# Altium footprint library con-samtec.PCBLIB: 805 footprints (part 12 of 55)
Each footprint in its own frame and in the unit in brackets; x right, y up, seen from the top. Pads: shape width x height; smd on the part's side, far side on the other; paste and mask are expansions set on the pad; w line width, h text height; cw(c..) or ccw(c..) is an arc to the next point about the centre after c.
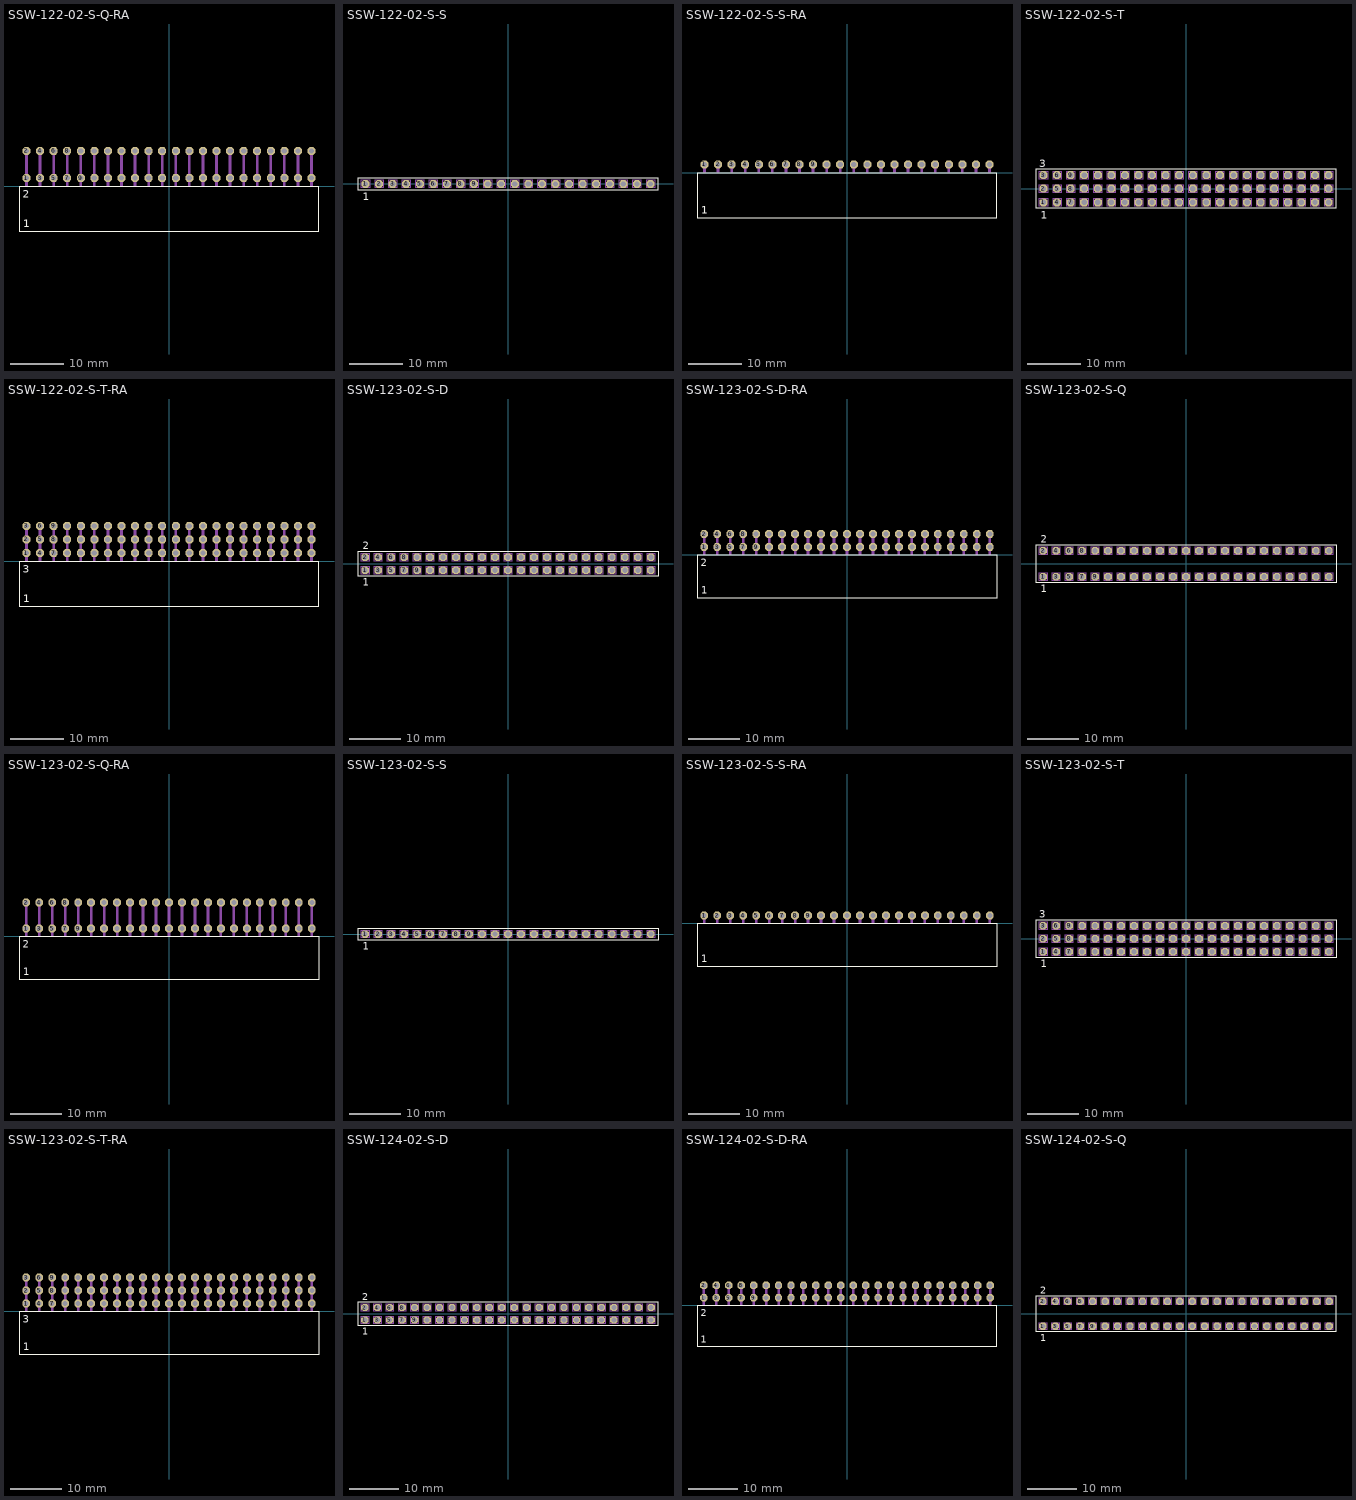
[diagram p11: the footprints below, top view; thin cyan lines are the x and y axes]

## SSW-122-02-S-Q-RA [mil]
pads (44):
  oct 59.06x59.06 hole 39.37: 1(-1050,60) 2(-1050,260) 3(-950,60) 4(-950,260) 5(-850,60) 6(-850,260) 7(-750,60) 8(-750,260) 9(-650,60) 10(-650,260) 11(-550,60) 12(-550,260) 13(-450,60) 14(-450,260) 15(-350,60) 16(-350,260) 17(-250,60) 18(-250,260) 19(-150,60) 20(-150,260) 21(-50,60) 22(-50,260) 23(50,60) 24(50,260) 25(150,60) 26(150,260) 27(250,60) 28(250,260) 29(350,60) 30(350,260) 31(450,60) 32(450,260) 33(550,60) 34(550,260) 35(650,60) 36(650,260) 37(750,60) 38(750,260) 39(850,60) 40(850,260) 41(950,60) 42(950,260) 43(1050,60) 44(1050,260)
Top Overlay:
  lines w8: -1105.08,-330.55 1105.08,-330.55 1105.08,-4.17 -1105.08,-4.17 -1105.08,-330.55
  text "1" at -1073.43,-301.18 h56.1
  text "2" at -1076.38,-86.61 h56.1
Mechanical 16:
  rectangle: -1060,0 -1040,270
  rectangle: -960,0 -940,270
  rectangle: -860,0 -840,270
  rectangle: -760,0 -740,270
  rectangle: -660,0 -640,270
  rectangle: -560,0 -540,270
  rectangle: -460,0 -440,270
  rectangle: -360,0 -340,270
  rectangle: -260,0 -240,270
  rectangle: -160,0 -140,270
  rectangle: -60,0 -40,270
  rectangle: 40,0 60,270
  rectangle: 140,0 160,270
  rectangle: 240,0 260,270
  rectangle: 340,0 360,270
  rectangle: 440,0 460,270
  rectangle: 540,0 560,270
  rectangle: 640,0 660,270
  rectangle: 740,0 760,270
  rectangle: 840,0 860,270
  rectangle: 940,0 960,270
  rectangle: 1040,0 1060,270

## SSW-122-02-S-S [mm]
pads (22):
  oct 1.5x1.5 hole 1: 1(-26.67,0) 2(-24.13,0) 3(-21.59,0) 4(-19.05,0) 5(-16.51,0) 6(-13.97,0) 7(-11.43,0) 8(-8.89,0) 9(-6.35,0) 10(-3.81,0) 11(-1.27,0) 12(1.27,0) 13(3.81,0) 14(6.35,0) 15(8.89,0) 16(11.43,0) 17(13.97,0) 18(16.51,0) 19(19.05,0) 20(21.59,0) 21(24.13,0) 22(26.67,0)
Top Overlay:
  lines w0.203: -28.069,-1.155 28.069,-1.155 28.069,1.155 -28.069,1.155 -28.069,-1.155
  text "1" at -27.178,-3.048 h1.42
Mechanical 16:
  lines w0.203: -27.415,-0.745 -25.915,-0.745 -25.915,0.755 -27.415,0.755 -27.415,-0.745 ; -24.875,-0.745 -23.375,-0.745 -23.375,0.755 -24.875,0.755 -24.875,-0.745 ; -22.335,-0.745 -20.835,-0.745 -20.835,0.755 -22.335,0.755 -22.335,-0.745 ; -19.795,-0.745 -18.295,-0.745 -18.295,0.755 -19.795,0.755 -19.795,-0.745 ; -17.255,-0.745 -15.755,-0.745 -15.755,0.755 -17.255,0.755 -17.255,-0.745 ; -14.715,-0.745 -13.215,-0.745 -13.215,0.755 -14.715,0.755 -14.715,-0.745 ; -12.175,-0.745 -10.675,-0.745 -10.675,0.755 -12.175,0.755 -12.175,-0.745 ; -9.635,-0.745 -8.135,-0.745 -8.135,0.755 -9.635,0.755 -9.635,-0.745 ; -7.095,-0.745 -5.595,-0.745 -5.595,0.755 -7.095,0.755 -7.095,-0.745 ; -4.555,-0.745 -3.055,-0.745 -3.055,0.755 -4.555,0.755 -4.555,-0.745 ; -2.015,-0.745 -0.515,-0.745 -0.515,0.755 -2.015,0.755 -2.015,-0.745 ; 0.525,-0.745 2.025,-0.745 2.025,0.755 0.525,0.755 0.525,-0.745 ; 3.065,-0.745 4.565,-0.745 4.565,0.755 3.065,0.755 3.065,-0.745 ; 5.605,-0.745 7.105,-0.745 7.105,0.755 5.605,0.755 5.605,-0.745 ; 8.145,-0.745 9.645,-0.745 9.645,0.755 8.145,0.755 8.145,-0.745 ; 10.685,-0.745 12.185,-0.745 12.185,0.755 10.685,0.755 10.685,-0.745 ; 13.225,-0.745 14.725,-0.745 14.725,0.755 13.225,0.755 13.225,-0.745 ; 15.765,-0.745 17.265,-0.745 17.265,0.755 15.765,0.755 15.765,-0.745 ; 18.305,-0.745 19.805,-0.745 19.805,0.755 18.305,0.755 18.305,-0.745 ; 20.845,-0.745 22.345,-0.745 22.345,0.755 20.845,0.755 20.845,-0.745 ; 23.385,-0.745 24.885,-0.745 24.885,0.755 23.385,0.755 23.385,-0.745 ; 25.925,-0.745 27.425,-0.745 27.425,0.755 25.925,0.755 25.925,-0.745

## SSW-122-02-S-S-RA [mil]
pads (22):
  oct 59.06x59.06 hole 39.37: 1(-1050,60) 2(-950,60) 3(-850,60) 4(-750,60) 5(-650,60) 6(-550,60) 7(-450,60) 8(-350,60) 9(-250,60) 10(-150,60) 11(-50,60) 12(50,60) 13(150,60) 14(250,60) 15(350,60) 16(450,60) 17(550,60) 18(650,60) 19(750,60) 20(850,60) 21(950,60) 22(1050,60)
Top Overlay:
  lines w8: -1105.08,-330.55 1105.08,-330.55 1105.08,-4.17 -1105.08,-4.17 -1105.08,-330.55
  text "1" at -1073.43,-301.18 h56.1
Mechanical 16:
  rectangle: -1060,0 -1040,70
  rectangle: -960,0 -940,70
  rectangle: -860,0 -840,70
  rectangle: -760,0 -740,70
  rectangle: -660,0 -640,70
  rectangle: -560,0 -540,70
  rectangle: -460,0 -440,70
  rectangle: -360,0 -340,70
  rectangle: -260,0 -240,70
  rectangle: -160,0 -140,70
  rectangle: -60,0 -40,70
  rectangle: 40,0 60,70
  rectangle: 140,0 160,70
  rectangle: 240,0 260,70
  rectangle: 340,0 360,70
  rectangle: 440,0 460,70
  rectangle: 540,0 560,70
  rectangle: 640,0 660,70
  rectangle: 740,0 760,70
  rectangle: 840,0 860,70
  rectangle: 940,0 960,70
  rectangle: 1040,0 1060,70

## SSW-122-02-S-T [mm]
pads (66):
  oct 1.5x1.5 hole 1: 1(-26.67,-2.54) 2(-26.67,0) 3(-26.67,2.54) 4(-24.13,-2.54) 5(-24.13,0) 6(-24.13,2.54) 7(-21.59,-2.54) 8(-21.59,0) 9(-21.59,2.54) 10(-19.05,-2.54) 11(-19.05,0) 12(-19.05,2.54) 13(-16.51,-2.54) 14(-16.51,0) 15(-16.51,2.54) 16(-13.97,-2.54) 17(-13.97,0) 18(-13.97,2.54) 19(-11.43,-2.54) 20(-11.43,0) 21(-11.43,2.54) 22(-8.89,-2.54) 23(-8.89,0) 24(-8.89,2.54) 25(-6.35,-2.54) 26(-6.35,0) 27(-6.35,2.54) 28(-3.81,-2.54) 29(-3.81,0) 30(-3.81,2.54) 31(-1.27,-2.54) 32(-1.27,0) 33(-1.27,2.54) 34(1.27,-2.54) 35(1.27,0) 36(1.27,2.54) 37(3.81,-2.54) 38(3.81,0) 39(3.81,2.54) 40(6.35,-2.54) 41(6.35,0) 42(6.35,2.54) 43(8.89,-2.54) 44(8.89,0) 45(8.89,2.54) 46(11.43,-2.54) 47(11.43,0) 48(11.43,2.54) 49(13.97,-2.54) 50(13.97,0) 51(13.97,2.54) 52(16.51,-2.54) 53(16.51,0) 54(16.51,2.54) 55(19.05,-2.54) 56(19.05,0) 57(19.05,2.54) 58(21.59,-2.54) 59(21.59,0) 60(21.59,2.54) 61(24.13,-2.54) 62(24.13,0) 63(24.13,2.54) 64(26.67,-2.54) 65(26.67,0) 66(26.67,2.54)
Top Overlay:
  lines w0.203: -28.069,-3.695 28.069,-3.695 28.069,3.695 -28.069,3.695 -28.069,-3.695
  text "1" at -27.178,-5.588 h1.42
  text "3" at -27.432,4.064 h1.42
Mechanical 16:
  drawing of 264 lines, arcs and shapes, not listed

## SSW-122-02-S-T-RA [mil]
pads (66):
  oct 59.06x59.06 hole 39.37: 1(-1050,60) 2(-1050,160) 3(-1050,260) 4(-950,60) 5(-950,160) 6(-950,260) 7(-850,60) 8(-850,160) 9(-850,260) 10(-750,60) 11(-750,160) 12(-750,260) 13(-650,60) 14(-650,160) 15(-650,260) 16(-550,60) 17(-550,160) 18(-550,260) 19(-450,60) 20(-450,160) 21(-450,260) 22(-350,60) 23(-350,160) 24(-350,260) 25(-250,60) 26(-250,160) 27(-250,260) 28(-150,60) 29(-150,160) 30(-150,260) 31(-50,60) 32(-50,160) 33(-50,260) 34(50,60) 35(50,160) 36(50,260) 37(150,60) 38(150,160) 39(150,260) 40(250,60) 41(250,160) 42(250,260) 43(350,60) 44(350,160) 45(350,260) 46(450,60) 47(450,160) 48(450,260) 49(550,60) 50(550,160) 51(550,260) 52(650,60) 53(650,160) 54(650,260) 55(750,60) 56(750,160) 57(750,260) 58(850,60) 59(850,160) 60(850,260) 61(950,60) 62(950,160) 63(950,260) 64(1050,60) 65(1050,160) 66(1050,260)
Top Overlay:
  lines w8: -1105.08,-330.55 1105.08,-330.55 1105.08,-4.17 -1105.08,-4.17 -1105.08,-330.55
  text "1" at -1073.43,-301.18 h56.1
  text "3" at -1076.38,-86.61 h56.1
Mechanical 16:
  rectangle: -1060,0 -1040,270
  rectangle: -960,0 -940,270
  rectangle: -860,0 -840,270
  rectangle: -760,0 -740,270
  rectangle: -660,0 -640,270
  rectangle: -560,0 -540,270
  rectangle: -460,0 -440,270
  rectangle: -360,0 -340,270
  rectangle: -260,0 -240,270
  rectangle: -160,0 -140,270
  rectangle: -60,0 -40,270
  rectangle: 40,0 60,270
  rectangle: 140,0 160,270
  rectangle: 240,0 260,270
  rectangle: 340,0 360,270
  rectangle: 440,0 460,270
  rectangle: 540,0 560,270
  rectangle: 640,0 660,270
  rectangle: 740,0 760,270
  rectangle: 840,0 860,270
  rectangle: 940,0 960,270
  rectangle: 1040,0 1060,270

## SSW-123-02-S-D [mm]
pads (46):
  oct 1.5x1.5 hole 1: 1(-27.94,-1.27) 2(-27.94,1.27) 3(-25.4,-1.27) 4(-25.4,1.27) 5(-22.86,-1.27) 6(-22.86,1.27) 7(-20.32,-1.27) 8(-20.32,1.27) 9(-17.78,-1.27) 10(-17.78,1.27) 11(-15.24,-1.27) 12(-15.24,1.27) 13(-12.7,-1.27) 14(-12.7,1.27) 15(-10.16,-1.27) 16(-10.16,1.27) 17(-7.62,-1.27) 18(-7.62,1.27) 19(-5.08,-1.27) 20(-5.08,1.27) 21(-2.54,-1.27) 22(-2.54,1.27) 23(0,-1.27) 24(0,1.27) 25(2.54,-1.27) 26(2.54,1.27) 27(5.08,-1.27) 28(5.08,1.27) 29(7.62,-1.27) 30(7.62,1.27) 31(10.16,-1.27) 32(10.16,1.27) 33(12.7,-1.27) 34(12.7,1.27) 35(15.24,-1.27) 36(15.24,1.27) 37(17.78,-1.27) 38(17.78,1.27) 39(20.32,-1.27) 40(20.32,1.27) 41(22.86,-1.27) 42(22.86,1.27) 43(25.4,-1.27) 44(25.4,1.27) 45(27.94,-1.27) 46(27.94,1.27)
Top Overlay:
  lines w0.203: -29.339,-2.425 29.339,-2.425 29.339,2.425 -29.339,2.425 -29.339,-2.425
  text "1" at -28.448,-4.318 h1.42
  text "2" at -28.448,2.794 h1.42
Mechanical 16:
  drawing of 184 lines, arcs and shapes, not listed

## SSW-123-02-S-D-RA [mil]
pads (46):
  oct 59.06x59.06 hole 39.37: 1(-1100,60) 2(-1100,160) 3(-1000,60) 4(-1000,160) 5(-900,60) 6(-900,160) 7(-800,60) 8(-800,160) 9(-700,60) 10(-700,160) 11(-600,60) 12(-600,160) 13(-500,60) 14(-500,160) 15(-400,60) 16(-400,160) 17(-300,60) 18(-300,160) 19(-200,60) 20(-200,160) 21(-100,60) 22(-100,160) 23(0,60) 24(0,160) 25(100,60) 26(100,160) 27(200,60) 28(200,160) 29(300,60) 30(300,160) 31(400,60) 32(400,160) 33(500,60) 34(500,160) 35(600,60) 36(600,160) 37(700,60) 38(700,160) 39(800,60) 40(800,160) 41(900,60) 42(900,160) 43(1000,60) 44(1000,160) 45(1100,60) 46(1100,160)
Top Overlay:
  lines w8: -1155.08,-330.55 1155.08,-330.55 1155.08,-4.17 -1155.08,-4.17 -1155.08,-330.55
  text "1" at -1123.43,-301.18 h56.1
  text "2" at -1126.38,-86.61 h56.1
Mechanical 16:
  rectangle: -1110,0 -1090,170
  rectangle: -1010,0 -990,170
  rectangle: -910,0 -890,170
  rectangle: -810,0 -790,170
  rectangle: -710,0 -690,170
  rectangle: -610,0 -590,170
  rectangle: -510,0 -490,170
  rectangle: -410,0 -390,170
  rectangle: -310,0 -290,170
  rectangle: -210,0 -190,170
  rectangle: -110,0 -90,170
  rectangle: -10,0 10,170
  rectangle: 90,0 110,170
  rectangle: 190,0 210,170
  rectangle: 290,0 310,170
  rectangle: 390,0 410,170
  rectangle: 490,0 510,170
  rectangle: 590,0 610,170
  rectangle: 690,0 710,170
  rectangle: 790,0 810,170
  rectangle: 890,0 910,170
  rectangle: 990,0 1010,170
  rectangle: 1090,0 1110,170

## SSW-123-02-S-Q [mm]
pads (46):
  oct 1.5x1.5 hole 1: 1(-27.94,-2.54) 2(-27.94,2.54) 3(-25.4,-2.54) 4(-25.4,2.54) 5(-22.86,-2.54) 6(-22.86,2.54) 7(-20.32,-2.54) 8(-20.32,2.54) 9(-17.78,-2.54) 10(-17.78,2.54) 11(-15.24,-2.54) 12(-15.24,2.54) 13(-12.7,-2.54) 14(-12.7,2.54) 15(-10.16,-2.54) 16(-10.16,2.54) 17(-7.62,-2.54) 18(-7.62,2.54) 19(-5.08,-2.54) 20(-5.08,2.54) 21(-2.54,-2.54) 22(-2.54,2.54) 23(0,-2.54) 24(0,2.54) 25(2.54,-2.54) 26(2.54,2.54) 27(5.08,-2.54) 28(5.08,2.54) 29(7.62,-2.54) 30(7.62,2.54) 31(10.16,-2.54) 32(10.16,2.54) 33(12.7,-2.54) 34(12.7,2.54) 35(15.24,-2.54) 36(15.24,2.54) 37(17.78,-2.54) 38(17.78,2.54) 39(20.32,-2.54) 40(20.32,2.54) 41(22.86,-2.54) 42(22.86,2.54) 43(25.4,-2.54) 44(25.4,2.54) 45(27.94,-2.54) 46(27.94,2.54)
Top Overlay:
  lines w0.203: -29.339,-3.695 29.339,-3.695 29.339,3.695 -29.339,3.695 -29.339,-3.695
  text "1" at -28.448,-5.588 h1.42
  text "2" at -28.448,4.064 h1.42
Mechanical 16:
  drawing of 184 lines, arcs and shapes, not listed

## SSW-123-02-S-Q-RA [mil]
pads (46):
  oct 59.06x59.06 hole 39.37: 1(-1100,60) 2(-1100,260) 3(-1000,60) 4(-1000,260) 5(-900,60) 6(-900,260) 7(-800,60) 8(-800,260) 9(-700,60) 10(-700,260) 11(-600,60) 12(-600,260) 13(-500,60) 14(-500,260) 15(-400,60) 16(-400,260) 17(-300,60) 18(-300,260) 19(-200,60) 20(-200,260) 21(-100,60) 22(-100,260) 23(0,60) 24(0,260) 25(100,60) 26(100,260) 27(200,60) 28(200,260) 29(300,60) 30(300,260) 31(400,60) 32(400,260) 33(500,60) 34(500,260) 35(600,60) 36(600,260) 37(700,60) 38(700,260) 39(800,60) 40(800,260) 41(900,60) 42(900,260) 43(1000,60) 44(1000,260) 45(1100,60) 46(1100,260)
Top Overlay:
  lines w8: -1155.08,-330.55 1155.08,-330.55 1155.08,-4.17 -1155.08,-4.17 -1155.08,-330.55
  text "1" at -1123.43,-301.18 h56.1
  text "2" at -1126.38,-86.61 h56.1
Mechanical 16:
  rectangle: -1110,0 -1090,270
  rectangle: -1010,0 -990,270
  rectangle: -910,0 -890,270
  rectangle: -810,0 -790,270
  rectangle: -710,0 -690,270
  rectangle: -610,0 -590,270
  rectangle: -510,0 -490,270
  rectangle: -410,0 -390,270
  rectangle: -310,0 -290,270
  rectangle: -210,0 -190,270
  rectangle: -110,0 -90,270
  rectangle: -10,0 10,270
  rectangle: 90,0 110,270
  rectangle: 190,0 210,270
  rectangle: 290,0 310,270
  rectangle: 390,0 410,270
  rectangle: 490,0 510,270
  rectangle: 590,0 610,270
  rectangle: 690,0 710,270
  rectangle: 790,0 810,270
  rectangle: 890,0 910,270
  rectangle: 990,0 1010,270
  rectangle: 1090,0 1110,270

## SSW-123-02-S-S [mm]
pads (23):
  oct 1.5x1.5 hole 1: 1(-27.94,0) 2(-25.4,0) 3(-22.86,0) 4(-20.32,0) 5(-17.78,0) 6(-15.24,0) 7(-12.7,0) 8(-10.16,0) 9(-7.62,0) 10(-5.08,0) 11(-2.54,0) 12(0,0) 13(2.54,0) 14(5.08,0) 15(7.62,0) 16(10.16,0) 17(12.7,0) 18(15.24,0) 19(17.78,0) 20(20.32,0) 21(22.86,0) 22(25.4,0) 23(27.94,0)
Top Overlay:
  lines w0.203: -29.339,-1.155 29.339,-1.155 29.339,1.155 -29.339,1.155 -29.339,-1.155
  text "1" at -28.448,-3.048 h1.42
Mechanical 16:
  lines w0.203: -28.685,-0.745 -27.185,-0.745 -27.185,0.755 -28.685,0.755 -28.685,-0.745 ; -26.145,-0.745 -24.645,-0.745 -24.645,0.755 -26.145,0.755 -26.145,-0.745 ; -23.605,-0.745 -22.105,-0.745 -22.105,0.755 -23.605,0.755 -23.605,-0.745 ; -21.065,-0.745 -19.565,-0.745 -19.565,0.755 -21.065,0.755 -21.065,-0.745 ; -18.525,-0.745 -17.025,-0.745 -17.025,0.755 -18.525,0.755 -18.525,-0.745 ; -15.985,-0.745 -14.485,-0.745 -14.485,0.755 -15.985,0.755 -15.985,-0.745 ; -13.445,-0.745 -11.945,-0.745 -11.945,0.755 -13.445,0.755 -13.445,-0.745 ; -10.905,-0.745 -9.405,-0.745 -9.405,0.755 -10.905,0.755 -10.905,-0.745 ; -8.365,-0.745 -6.865,-0.745 -6.865,0.755 -8.365,0.755 -8.365,-0.745 ; -5.825,-0.745 -4.325,-0.745 -4.325,0.755 -5.825,0.755 -5.825,-0.745 ; -3.285,-0.745 -1.785,-0.745 -1.785,0.755 -3.285,0.755 -3.285,-0.745 ; -0.745,-0.745 0.755,-0.745 0.755,0.755 -0.745,0.755 -0.745,-0.745 ; 1.795,-0.745 3.295,-0.745 3.295,0.755 1.795,0.755 1.795,-0.745 ; 4.335,-0.745 5.835,-0.745 5.835,0.755 4.335,0.755 4.335,-0.745 ; 6.875,-0.745 8.375,-0.745 8.375,0.755 6.875,0.755 6.875,-0.745 ; 9.415,-0.745 10.915,-0.745 10.915,0.755 9.415,0.755 9.415,-0.745 ; 11.955,-0.745 13.455,-0.745 13.455,0.755 11.955,0.755 11.955,-0.745 ; 14.495,-0.745 15.995,-0.745 15.995,0.755 14.495,0.755 14.495,-0.745 ; 17.035,-0.745 18.535,-0.745 18.535,0.755 17.035,0.755 17.035,-0.745 ; 19.575,-0.745 21.075,-0.745 21.075,0.755 19.575,0.755 19.575,-0.745 ; 22.115,-0.745 23.615,-0.745 23.615,0.755 22.115,0.755 22.115,-0.745 ; 24.655,-0.745 26.155,-0.745 26.155,0.755 24.655,0.755 24.655,-0.745 ; 27.195,-0.745 28.695,-0.745 28.695,0.755 27.195,0.755 27.195,-0.745

## SSW-123-02-S-S-RA [mil]
pads (23):
  oct 59.06x59.06 hole 39.37: 1(-1100,60) 2(-1000,60) 3(-900,60) 4(-800,60) 5(-700,60) 6(-600,60) 7(-500,60) 8(-400,60) 9(-300,60) 10(-200,60) 11(-100,60) 12(0,60) 13(100,60) 14(200,60) 15(300,60) 16(400,60) 17(500,60) 18(600,60) 19(700,60) 20(800,60) 21(900,60) 22(1000,60) 23(1100,60)
Top Overlay:
  lines w8: -1155.08,-330.55 1155.08,-330.55 1155.08,-4.17 -1155.08,-4.17 -1155.08,-330.55
  text "1" at -1123.43,-301.18 h56.1
Mechanical 16:
  rectangle: -1110,0 -1090,70
  rectangle: -1010,0 -990,70
  rectangle: -910,0 -890,70
  rectangle: -810,0 -790,70
  rectangle: -710,0 -690,70
  rectangle: -610,0 -590,70
  rectangle: -510,0 -490,70
  rectangle: -410,0 -390,70
  rectangle: -310,0 -290,70
  rectangle: -210,0 -190,70
  rectangle: -110,0 -90,70
  rectangle: -10,0 10,70
  rectangle: 90,0 110,70
  rectangle: 190,0 210,70
  rectangle: 290,0 310,70
  rectangle: 390,0 410,70
  rectangle: 490,0 510,70
  rectangle: 590,0 610,70
  rectangle: 690,0 710,70
  rectangle: 790,0 810,70
  rectangle: 890,0 910,70
  rectangle: 990,0 1010,70
  rectangle: 1090,0 1110,70

## SSW-123-02-S-T [mm]
pads (69):
  oct 1.5x1.5 hole 1: 1(-27.94,-2.54) 2(-27.94,0) 3(-27.94,2.54) 4(-25.4,-2.54) 5(-25.4,0) 6(-25.4,2.54) 7(-22.86,-2.54) 8(-22.86,0) 9(-22.86,2.54) 10(-20.32,-2.54) 11(-20.32,0) 12(-20.32,2.54) 13(-17.78,-2.54) 14(-17.78,0) 15(-17.78,2.54) 16(-15.24,-2.54) 17(-15.24,0) 18(-15.24,2.54) 19(-12.7,-2.54) 20(-12.7,0) 21(-12.7,2.54) 22(-10.16,-2.54) 23(-10.16,0) 24(-10.16,2.54) 25(-7.62,-2.54) 26(-7.62,0) 27(-7.62,2.54) 28(-5.08,-2.54) 29(-5.08,0) 30(-5.08,2.54) 31(-2.54,-2.54) 32(-2.54,0) 33(-2.54,2.54) 34(0,-2.54) 35(0,0) 36(0,2.54) 37(2.54,-2.54) 38(2.54,0) 39(2.54,2.54) 40(5.08,-2.54) 41(5.08,0) 42(5.08,2.54) 43(7.62,-2.54) 44(7.62,0) 45(7.62,2.54) 46(10.16,-2.54) 47(10.16,0) 48(10.16,2.54) 49(12.7,-2.54) 50(12.7,0) 51(12.7,2.54) 52(15.24,-2.54) 53(15.24,0) 54(15.24,2.54) 55(17.78,-2.54) 56(17.78,0) 57(17.78,2.54) 58(20.32,-2.54) 59(20.32,0) 60(20.32,2.54) 61(22.86,-2.54) 62(22.86,0) 63(22.86,2.54) 64(25.4,-2.54) 65(25.4,0) 66(25.4,2.54) 67(27.94,-2.54) 68(27.94,0) 69(27.94,2.54)
Top Overlay:
  lines w0.203: -29.339,-3.695 29.339,-3.695 29.339,3.695 -29.339,3.695 -29.339,-3.695
  text "1" at -28.448,-5.588 h1.42
  text "3" at -28.702,4.064 h1.42
Mechanical 16:
  drawing of 276 lines, arcs and shapes, not listed

## SSW-123-02-S-T-RA [mil]
pads (69):
  oct 59.06x59.06 hole 39.37: 1(-1100,60) 2(-1100,160) 3(-1100,260) 4(-1000,60) 5(-1000,160) 6(-1000,260) 7(-900,60) 8(-900,160) 9(-900,260) 10(-800,60) 11(-800,160) 12(-800,260) 13(-700,60) 14(-700,160) 15(-700,260) 16(-600,60) 17(-600,160) 18(-600,260) 19(-500,60) 20(-500,160) 21(-500,260) 22(-400,60) 23(-400,160) 24(-400,260) 25(-300,60) 26(-300,160) 27(-300,260) 28(-200,60) 29(-200,160) 30(-200,260) 31(-100,60) 32(-100,160) 33(-100,260) 34(0,60) 35(0,160) 36(0,260) 37(100,60) 38(100,160) 39(100,260) 40(200,60) 41(200,160) 42(200,260) 43(300,60) 44(300,160) 45(300,260) 46(400,60) 47(400,160) 48(400,260) 49(500,60) 50(500,160) 51(500,260) 52(600,60) 53(600,160) 54(600,260) 55(700,60) 56(700,160) 57(700,260) 58(800,60) 59(800,160) 60(800,260) 61(900,60) 62(900,160) 63(900,260) 64(1000,60) 65(1000,160) 66(1000,260) 67(1100,60) 68(1100,160) 69(1100,260)
Top Overlay:
  lines w8: -1155.08,-330.55 1155.08,-330.55 1155.08,-4.17 -1155.08,-4.17 -1155.08,-330.55
  text "1" at -1123.43,-301.18 h56.1
  text "3" at -1126.38,-86.61 h56.1
Mechanical 16:
  rectangle: -1110,0 -1090,270
  rectangle: -1010,0 -990,270
  rectangle: -910,0 -890,270
  rectangle: -810,0 -790,270
  rectangle: -710,0 -690,270
  rectangle: -610,0 -590,270
  rectangle: -510,0 -490,270
  rectangle: -410,0 -390,270
  rectangle: -310,0 -290,270
  rectangle: -210,0 -190,270
  rectangle: -110,0 -90,270
  rectangle: -10,0 10,270
  rectangle: 90,0 110,270
  rectangle: 190,0 210,270
  rectangle: 290,0 310,270
  rectangle: 390,0 410,270
  rectangle: 490,0 510,270
  rectangle: 590,0 610,270
  rectangle: 690,0 710,270
  rectangle: 790,0 810,270
  rectangle: 890,0 910,270
  rectangle: 990,0 1010,270
  rectangle: 1090,0 1110,270

## SSW-124-02-S-D [mm]
pads (48):
  oct 1.5x1.5 hole 1: 1(-29.21,-1.27) 2(-29.21,1.27) 3(-26.67,-1.27) 4(-26.67,1.27) 5(-24.13,-1.27) 6(-24.13,1.27) 7(-21.59,-1.27) 8(-21.59,1.27) 9(-19.05,-1.27) 10(-19.05,1.27) 11(-16.51,-1.27) 12(-16.51,1.27) 13(-13.97,-1.27) 14(-13.97,1.27) 15(-11.43,-1.27) 16(-11.43,1.27) 17(-8.89,-1.27) 18(-8.89,1.27) 19(-6.35,-1.27) 20(-6.35,1.27) 21(-3.81,-1.27) 22(-3.81,1.27) 23(-1.27,-1.27) 24(-1.27,1.27) 25(1.27,-1.27) 26(1.27,1.27) 27(3.81,-1.27) 28(3.81,1.27) 29(6.35,-1.27) 30(6.35,1.27) 31(8.89,-1.27) 32(8.89,1.27) 33(11.43,-1.27) 34(11.43,1.27) 35(13.97,-1.27) 36(13.97,1.27) 37(16.51,-1.27) 38(16.51,1.27) 39(19.05,-1.27) 40(19.05,1.27) 41(21.59,-1.27) 42(21.59,1.27) 43(24.13,-1.27) 44(24.13,1.27) 45(26.67,-1.27) 46(26.67,1.27) 47(29.21,-1.27) 48(29.21,1.27)
Top Overlay:
  lines w0.203: -30.609,-2.425 30.609,-2.425 30.609,2.425 -30.609,2.425 -30.609,-2.425
  text "1" at -29.718,-4.318 h1.42
  text "2" at -29.718,2.794 h1.42
Mechanical 16:
  drawing of 192 lines, arcs and shapes, not listed

## SSW-124-02-S-D-RA [mil]
pads (48):
  oct 59.06x59.06 hole 39.37: 1(-1150,60) 2(-1150,160) 3(-1050,60) 4(-1050,160) 5(-950,60) 6(-950,160) 7(-850,60) 8(-850,160) 9(-750,60) 10(-750,160) 11(-650,60) 12(-650,160) 13(-550,60) 14(-550,160) 15(-450,60) 16(-450,160) 17(-350,60) 18(-350,160) 19(-250,60) 20(-250,160) 21(-150,60) 22(-150,160) 23(-50,60) 24(-50,160) 25(50,60) 26(50,160) 27(150,60) 28(150,160) 29(250,60) 30(250,160) 31(350,60) 32(350,160) 33(450,60) 34(450,160) 35(550,60) 36(550,160) 37(650,60) 38(650,160) 39(750,60) 40(750,160) 41(850,60) 42(850,160) 43(950,60) 44(950,160) 45(1050,60) 46(1050,160) 47(1150,60) 48(1150,160)
Top Overlay:
  lines w8: -1205.08,-330.55 1205.08,-330.55 1205.08,-4.17 -1205.08,-4.17 -1205.08,-330.55
  text "1" at -1173.43,-301.18 h56.1
  text "2" at -1176.38,-86.61 h56.1
Mechanical 16:
  rectangle: -1160,0 -1140,170
  rectangle: -1060,0 -1040,170
  rectangle: -960,0 -940,170
  rectangle: -860,0 -840,170
  rectangle: -760,0 -740,170
  rectangle: -660,0 -640,170
  rectangle: -560,0 -540,170
  rectangle: -460,0 -440,170
  rectangle: -360,0 -340,170
  rectangle: -260,0 -240,170
  rectangle: -160,0 -140,170
  rectangle: -60,0 -40,170
  rectangle: 40,0 60,170
  rectangle: 140,0 160,170
  rectangle: 240,0 260,170
  rectangle: 340,0 360,170
  rectangle: 440,0 460,170
  rectangle: 540,0 560,170
  rectangle: 640,0 660,170
  rectangle: 740,0 760,170
  rectangle: 840,0 860,170
  rectangle: 940,0 960,170
  rectangle: 1040,0 1060,170
  rectangle: 1140,0 1160,170

## SSW-124-02-S-Q [mm]
pads (48):
  oct 1.5x1.5 hole 1: 1(-29.21,-2.54) 2(-29.21,2.54) 3(-26.67,-2.54) 4(-26.67,2.54) 5(-24.13,-2.54) 6(-24.13,2.54) 7(-21.59,-2.54) 8(-21.59,2.54) 9(-19.05,-2.54) 10(-19.05,2.54) 11(-16.51,-2.54) 12(-16.51,2.54) 13(-13.97,-2.54) 14(-13.97,2.54) 15(-11.43,-2.54) 16(-11.43,2.54) 17(-8.89,-2.54) 18(-8.89,2.54) 19(-6.35,-2.54) 20(-6.35,2.54) 21(-3.81,-2.54) 22(-3.81,2.54) 23(-1.27,-2.54) 24(-1.27,2.54) 25(1.27,-2.54) 26(1.27,2.54) 27(3.81,-2.54) 28(3.81,2.54) 29(6.35,-2.54) 30(6.35,2.54) 31(8.89,-2.54) 32(8.89,2.54) 33(11.43,-2.54) 34(11.43,2.54) 35(13.97,-2.54) 36(13.97,2.54) 37(16.51,-2.54) 38(16.51,2.54) 39(19.05,-2.54) 40(19.05,2.54) 41(21.59,-2.54) 42(21.59,2.54) 43(24.13,-2.54) 44(24.13,2.54) 45(26.67,-2.54) 46(26.67,2.54) 47(29.21,-2.54) 48(29.21,2.54)
Top Overlay:
  lines w0.203: -30.609,-3.695 30.609,-3.695 30.609,3.695 -30.609,3.695 -30.609,-3.695
  text "1" at -29.718,-5.588 h1.42
  text "2" at -29.718,4.064 h1.42
Mechanical 16:
  drawing of 192 lines, arcs and shapes, not listed